# Altium footprint library Tomra_Cadstar_Footprints.PcbLib: 380 footprints (part 8 of 24)
Each footprint in its own frame and in the unit in brackets; x right, y up, seen from the top. Pads: shape width x height; smd on the part's side, far side on the other; paste and mask are expansions set on the pad; w line width, h text height; cw(c..) or ccw(c..) is an arc to the next point about the centre after c.
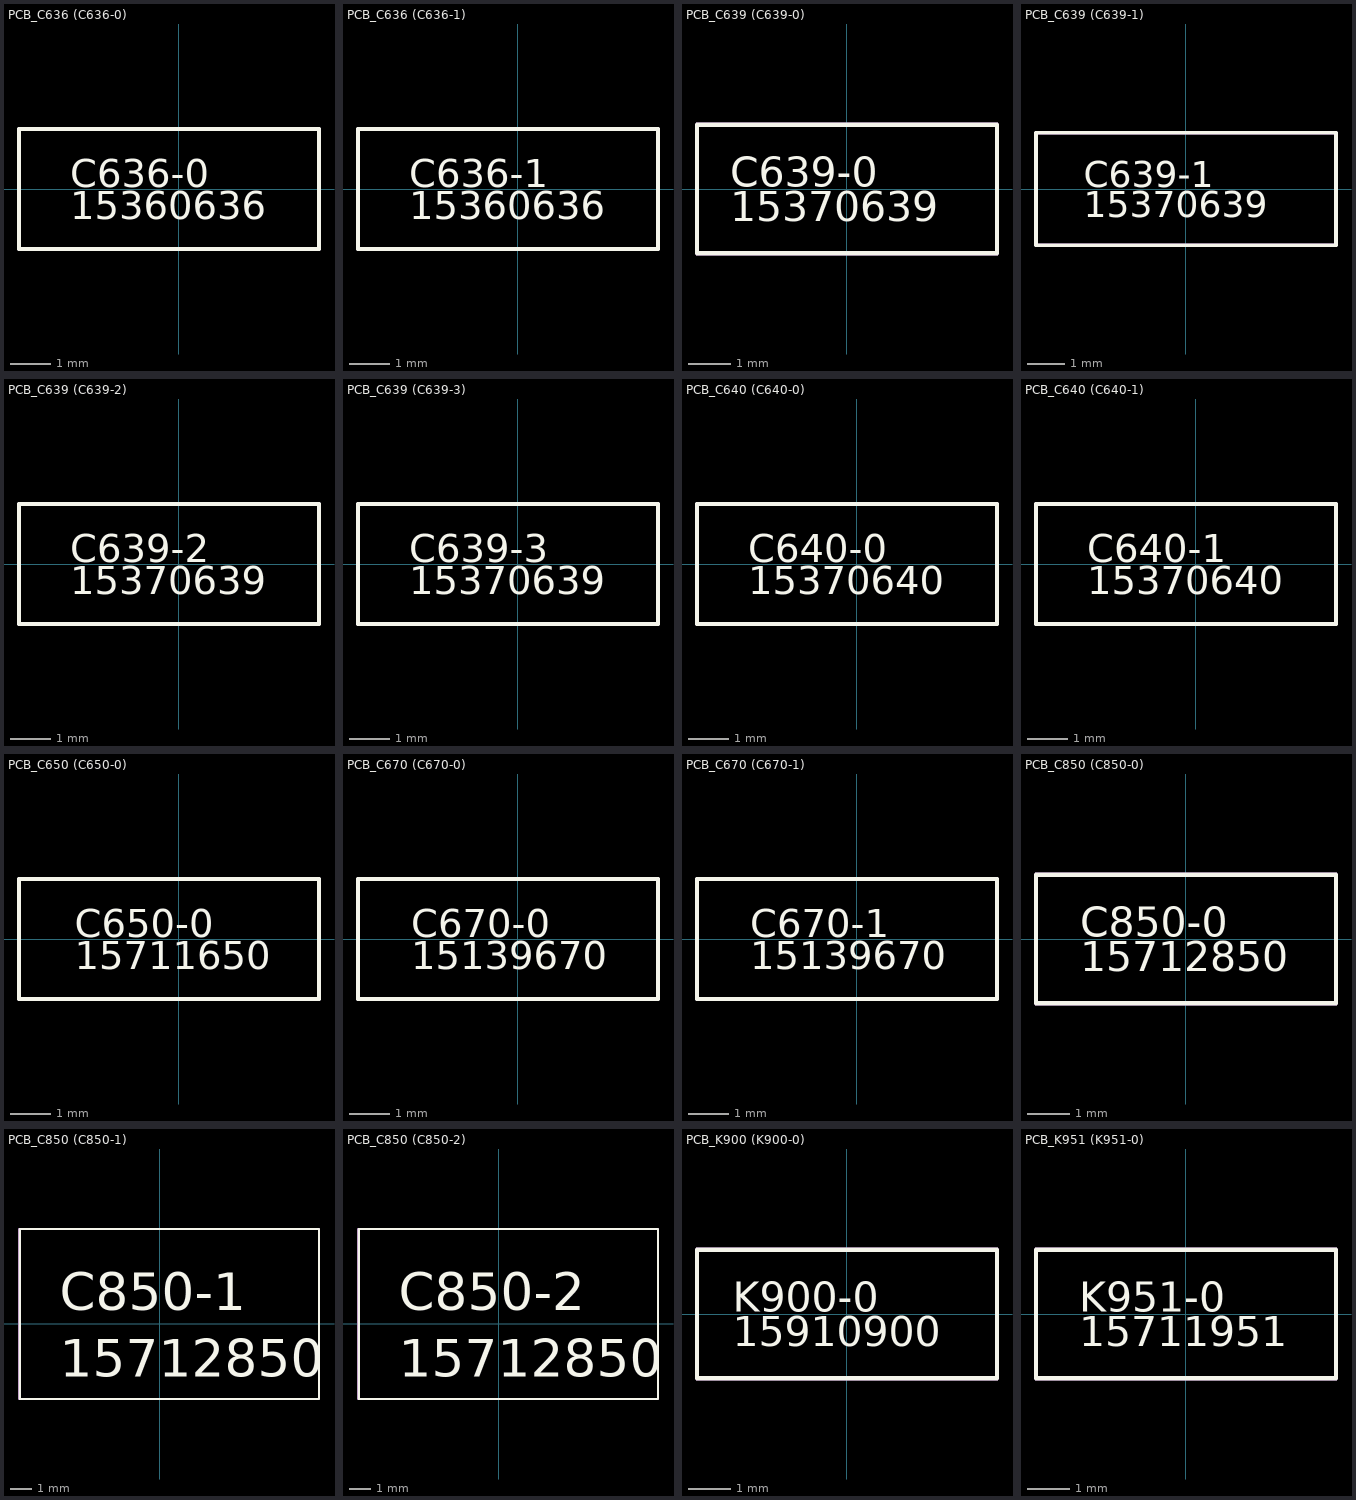
[diagram p7: the footprints below, top view; thin cyan lines are the x and y axes]

## PCB_C636 (C636-0) [mm]
height 0.1
Top Silk:
  lines w0.1: -4,-1.5 3.5,-1.5 3.5,1.5 -4,1.5 -4,-1.5
  text "15360636" at -2.724,-0.75 h0.7
  text "C636-0" at -2.724,0.05 h0.7
Top Placement:
  lines w0.1: -4,-1.5 3.5,-1.5 3.5,1.5 -4,1.5 -4,-1.5
  text "15360636" at -2.724,-0.75 h0.7
  text "C636-0" at -2.724,0.05 h0.7

## PCB_C636 (C636-1) [mm]
height 0.1
Top Silk:
  lines w0.1: -4,-1.5 3.5,-1.5 3.5,1.5 -4,1.5 -4,-1.5
  text "15360636" at -2.724,-0.75 h0.7
  text "C636-1" at -2.724,0.05 h0.7
Top Placement:
  lines w0.1: -4,-1.5 3.5,-1.5 3.5,1.5 -4,1.5 -4,-1.5
  text "15360636" at -2.724,-0.75 h0.7
  text "C636-1" at -2.724,0.05 h0.7

## PCB_C639 (C639-0) [mm]
height 0.1
Top Silk:
  lines w0.1: -3.5,-1.5 3.5,-1.5 3.5,1.5 -3.5,1.5 -3.5,-1.5
  text "15370639" at -2.724,-0.75 h0.7
  text "C639-0" at -2.724,0.05 h0.7
Top Placement:
  lines w0.1: -3.5,-1.5 3.5,-1.5 3.5,1.5 -3.5,1.5 -3.5,-1.5
  text "15370639" at -2.724,-0.75 h0.7
  text "C639-0" at -2.724,0.05 h0.7

## PCB_C639 (C639-1) [mm]
height 0.1
Top Silk:
  lines w0.1: -4,-1.5 4,-1.5 4,1.5 -4,1.5 -4,-1.5
  text "15370639" at -2.724,-0.75 h0.7
  text "C639-1" at -2.724,0.05 h0.7
Top Placement:
  lines w0.1: -4,-1.5 4,-1.5 4,1.5 -4,1.5 -4,-1.5
  text "15370639" at -2.724,-0.75 h0.7
  text "C639-1" at -2.724,0.05 h0.7

## PCB_C639 (C639-2) [mm]
height 0.1
Top Silk:
  lines w0.1: -4,-1.5 3.5,-1.5 3.5,1.5 -4,1.5 -4,-1.5
  text "15370639" at -2.724,-0.75 h0.7
  text "C639-2" at -2.724,0.05 h0.7
Top Placement:
  lines w0.1: -4,-1.5 3.5,-1.5 3.5,1.5 -4,1.5 -4,-1.5
  text "15370639" at -2.724,-0.75 h0.7
  text "C639-2" at -2.724,0.05 h0.7

## PCB_C639 (C639-3) [mm]
height 0.1
Top Silk:
  lines w0.1: -4,-1.5 3.5,-1.5 3.5,1.5 -4,1.5 -4,-1.5
  text "15370639" at -2.724,-0.75 h0.7
  text "C639-3" at -2.724,0.05 h0.7
Top Placement:
  lines w0.1: -4,-1.5 3.5,-1.5 3.5,1.5 -4,1.5 -4,-1.5
  text "15370639" at -2.724,-0.75 h0.7
  text "C639-3" at -2.724,0.05 h0.7

## PCB_C640 (C640-0) [mm]
height 0.1
Top Silk:
  lines w0.1: -4,-1.5 3.5,-1.5 3.5,1.5 -4,1.5 -4,-1.5
  text "15370640" at -2.724,-0.75 h0.7
  text "C640-0" at -2.724,0.05 h0.7
Top Placement:
  lines w0.1: -4,-1.5 3.5,-1.5 3.5,1.5 -4,1.5 -4,-1.5
  text "15370640" at -2.724,-0.75 h0.7
  text "C640-0" at -2.724,0.05 h0.7

## PCB_C640 (C640-1) [mm]
height 0.1
Top Silk:
  lines w0.1: -4,-1.5 3.5,-1.5 3.5,1.5 -4,1.5 -4,-1.5
  text "15370640" at -2.724,-0.75 h0.7
  text "C640-1" at -2.724,0.05 h0.7
Top Placement:
  lines w0.1: -4,-1.5 3.5,-1.5 3.5,1.5 -4,1.5 -4,-1.5
  text "15370640" at -2.724,-0.75 h0.7
  text "C640-1" at -2.724,0.05 h0.7

## PCB_C650 (C650-0) [mm]
height 0.1
Top Silk:
  lines w0.1: -4,-1.5 3.5,-1.5 3.5,1.5 -4,1.5 -4,-1.5
  text "15711650" at -2.608,-0.75 h0.7
  text "C650-0" at -2.608,0.05 h0.7
Top Placement:
  lines w0.1: -4,-1.5 3.5,-1.5 3.5,1.5 -4,1.5 -4,-1.5
  text "15711650" at -2.608,-0.75 h0.7
  text "C650-0" at -2.608,0.05 h0.7

## PCB_C670 (C670-0) [mm]
height 0.1
Top Silk:
  lines w0.1: -4,-1.5 3.5,-1.5 3.5,1.5 -4,1.5 -4,-1.5
  text "15139670" at -2.666,-0.75 h0.7
  text "C670-0" at -2.666,0.05 h0.7
Top Placement:
  lines w0.1: -4,-1.5 3.5,-1.5 3.5,1.5 -4,1.5 -4,-1.5
  text "15139670" at -2.666,-0.75 h0.7
  text "C670-0" at -2.666,0.05 h0.7

## PCB_C670 (C670-1) [mm]
height 0.1
Top Silk:
  lines w0.1: -4,-1.5 3.5,-1.5 3.5,1.5 -4,1.5 -4,-1.5
  text "15139670" at -2.666,-0.75 h0.7
  text "C670-1" at -2.666,0.05 h0.7
Top Placement:
  lines w0.1: -4,-1.5 3.5,-1.5 3.5,1.5 -4,1.5 -4,-1.5
  text "15139670" at -2.666,-0.75 h0.7
  text "C670-1" at -2.666,0.05 h0.7

## PCB_C850 (C850-0) [mm]
height 0.1
Top Silk:
  lines w0.1: -3.5,-1.5 3.5,-1.5 3.5,1.5 -3.5,1.5 -3.5,-1.5
  text "15712850" at -2.466,-0.75 h0.7
  text "C850-0" at -2.466,0.05 h0.7
Top Placement:
  lines w0.1: -3.5,-1.5 3.5,-1.5 3.5,1.5 -3.5,1.5 -3.5,-1.5
  text "15712850" at -2.466,-0.75 h0.7
  text "C850-0" at -2.466,0.05 h0.7

## PCB_C850 (C850-1) [mm]
height 0.1
Top Silk:
  lines w0.1: -6.5,-3.5 7.4,-3.5 7.4,4.4 -6.5,4.4 -6.5,-3.5
  text "15712850" at -4.631,-3.05 h3
  text "C850-1" at -4.631,0.05 h3
Top Placement:
  lines w0.1: -6.533,-3.5 7.4,-3.5 7.4,4.4 -6.533,4.4 -6.533,-3.5
  text "15712850" at -4.631,-3.05 h3
  text "C850-1" at -4.631,0.05 h3

## PCB_C850 (C850-2) [mm]
height 0.1
Top Silk:
  lines w0.1: -6.5,-3.5 7.4,-3.5 7.4,4.4 -6.5,4.4 -6.5,-3.5
  text "15712850" at -4.631,-3.05 h3
  text "C850-2" at -4.631,0.05 h3
Top Placement:
  lines w0.1: -6.533,-3.5 7.4,-3.5 7.4,4.4 -6.533,4.4 -6.533,-3.5
  text "15712850" at -4.631,-3.05 h3
  text "C850-2" at -4.631,0.05 h3

## PCB_K900 (K900-0) [mm]
height 0.1
Top Silk:
  lines w0.1: -3.5,-1.5 3.5,-1.5 3.5,1.5 -3.5,1.5 -3.5,-1.5
  text "15910900" at -2.666,-0.75 h0.7
  text "K900-0" at -2.666,0.05 h0.7
Top Placement:
  lines w0.1: -3.5,-1.5 3.5,-1.5 3.5,1.5 -3.5,1.5 -3.5,-1.5
  text "15910900" at -2.666,-0.75 h0.7
  text "K900-0" at -2.666,0.05 h0.7

## PCB_K951 (K951-0) [mm]
height 0.1
Top Silk:
  lines w0.1: -3.5,-1.5 3.5,-1.5 3.5,1.5 -3.5,1.5 -3.5,-1.5
  text "15711951" at -2.491,-0.75 h0.7
  text "K951-0" at -2.491,0.05 h0.7
Top Placement:
  lines w0.1: -3.5,-1.5 3.5,-1.5 3.5,1.5 -3.5,1.5 -3.5,-1.5
  text "15711951" at -2.491,-0.75 h0.7
  text "K951-0" at -2.491,0.05 h0.7